# Altium footprint library DrPCB.PcbLib: 910 footprints (part 40 of 57)
Each footprint in its own frame and in the unit in brackets; x right, y up, seen from the top. Pads: shape width x height; smd on the part's side, far side on the other; paste and mask are expansions set on the pad; w line width, h text height; cw(c..) or ccw(c..) is an arc to the next point about the centre after c.
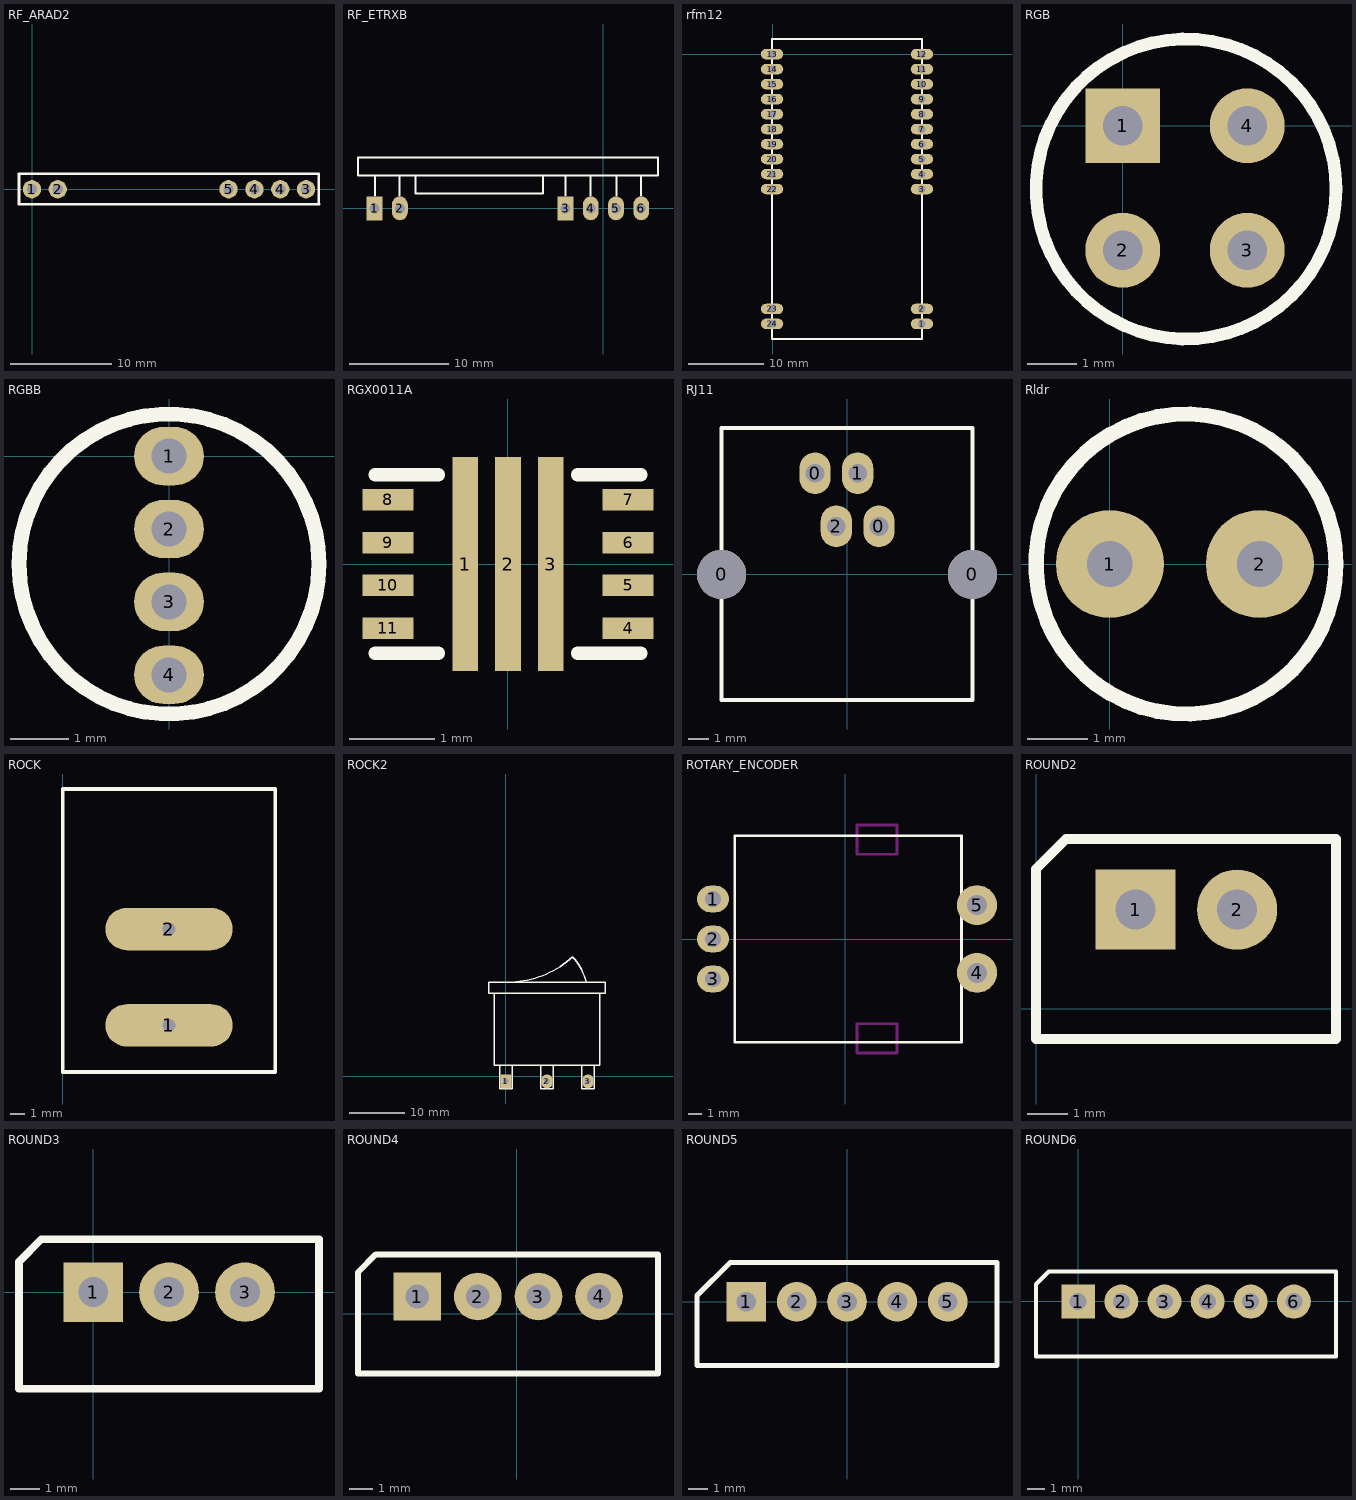
[diagram p39: the footprints below, top view; thin cyan lines are the x and y axes]

## RF_ARAD2 [mm]
pads (6):
  round 1.8 hole 1: 1(-0.013,0) 2(2.527,0) 3(26.947,0) 4(21.867,0) 4(24.407,0) 5(19.327,0)
Top Overlay:
  lines w0.254: -1.283,-1.486 28.219,-1.486 ; -1.283,-1.485 -1.283,1.537 28.194,1.537 28.194,-1.473

## RF_ETRXB [mm] "Module RF, Receiver, ET-RXB-12, ET-RXB-22"
pads (6):
  rect 1.6x2.4 hole 1: 1(-23.03,0) 3(-3.81,0)
  oval 1.6x2.4 hole 1: 2(-20.49,0) 4(-1.27,0) 5(1.27,0) 6(3.81,0)
Top Overlay:
  lines w0.2: -23,1.3 -23,3.3 ; -20.5,1.3 -20.5,3.3 ; -18.9,3.3 -18.9,1.5 -6.1,1.5 -6.1,3.3 ; -3.8,1.3 -3.8,3.3 ; -1.3,1.3 -1.3,3.3 ; 1.3,1.3 1.3,3.3 ; 3.8,1.3 3.8,3.3 ; -24.7,3.3 5.5,3.3 5.5,5.1 -24.7,5.1 -24.7,3.3
3D body "RF_ETRXB.step": height 8.5, standoff -6.05, extent -24.6,-2.05 5.4,6.4

## rfm12 [mm]
pads (24):
  oval 3x1.4 hole 1: 1(19.889,-35.997) 2(19.889,-33.997) 3(19.889,-17.997) 4(19.889,-15.997) 5(19.889,-13.997) 6(19.889,-11.997) 7(19.889,-9.997) 8(19.889,-7.997) 9(19.889,-5.997) 10(19.889,-3.997) 11(19.889,-1.997) 12(19.889,0.003) 13(-0.111,0.003) 14(-0.111,-1.997) 15(-0.111,-3.997) 16(-0.111,-5.997) 17(-0.111,-7.997) 18(-0.111,-9.997) 19(-0.111,-11.997) 20(-0.111,-13.997) 21(-0.111,-15.997) 22(-0.111,-17.997) 23(-0.111,-33.997) 24(-0.111,-35.997)
Top Overlay:
  lines w0.254: -0.131,2.012 19.877,2.012 ; -0.129,2.014 -0.129,-38.004 19.867,-38.004 19.878,-37.993 19.878,2.012

## RGB [mm]
pads (4):
  rect 1.5x1.5 hole 0.8: 1(0,0)
  round 1.5 hole 0.8: 2(0,-2.5) 3(2.5,-2.5) 4(2.5,0)
Top Overlay:
  circle w0.254: c1.27,-1.27 r3.011

## RGBB [mm]
pads (4):
  oval 1.2x1 hole 0.6: 1(0,0) 2(0,-1.25) 3(0,-2.5) 4(0,-3.75)
Top Overlay:
  circle w0.254: c0,-1.85 r2.572

## RGX0011A [mm]
pads (11):
  rect 0.3x2.5 smd paste-2: 1(-0.5,0) 2(0,0) 3(0.5,0)
  rect 0.6x0.25 smd: 4(1.4,-0.75) 5(1.4,-0.25) 6(1.4,0.25) 7(1.4,0.75) 8(-1.4,0.75) 9(-1.4,0.25) 10(-1.4,-0.25) 11(-1.4,-0.75)
Top Overlay:
  lines w0.152: -1.549,-1.041 -0.813,-1.041 ; -1.549,1.041 -0.813,1.041 ; 0.813,-1.041 1.549,-1.041 ; 0.813,1.041 1.549,1.041
Top Paste:
  drawing of 9 lines, arcs and shapes, not listed
3D body "User Library-Tps 62135.SLDPRT": height 1.05, standoff 0, extent -1.55,-1.05 1.55,1.05

## RJ11 [mm]
pads (6):
  round 2.35 hole 2.35: 0(-6,0) 0(6,0)
  oval 1.5x2 hole 0.9: 0(-1.53,4.84) 0(1.53,2.3) 1(0.51,4.84) 2(-0.51,2.3)
Top Overlay:
  lines w0.2: -6,-6 -6,7 6,7 6,-6 -6,-6

## Rldr [mm]
pads (2):
  round 1.8 hole 0.762: 1(0,0) 2(2.5,0)
Top Overlay:
  circle w0.254: c1.27,0 r2.5

## ROCK [mm]
pads (2):
  oval 9x3 hole 0.9: 1(7.499,8.84) 2(7.499,15.64)
Top Overlay:
  lines w0.254: 0,5.54 0,25.54 15,25.54 15,5.54 0,5.54

## ROCK2 [mm]
pads (3):
  rect 2x2.5 hole 1: 1(0,-0.889)
  oval 2x2.5 hole 1: 2(7.4,-0.889) 3(14.8,-0.889)
Top Overlay:
  lines w0.254: -3.1,17 -3.1,15 17.9,15 17.9,17 17.894,17.005 -3.099,17.005 ; -2.1,15 -2.1,2 16.9,2 16.9,15 ; -1.13,1.994 -1.13,-2.261 1.105,-2.261 1.13,-2.235 1.13,1.981 ; -0.399,17.019 ccw(c0.273,34.43) 12.052,21.59 ; 6.274,1.981 6.274,-2.248 6.286,-2.261 8.522,-2.261 ; 8.522,-2.248 8.522,1.994 ; 12.089,21.544 cw(c3.344,13.975) 14.473,17.125 ; 13.678,2.007 13.678,-2.261 15.938,-2.261 15.938,1.994

## ROTARY_ENCODER [mm]
pads (5):
  oval 2.4x2 hole 1.2: 1(-9.9,3) 2(-9.9,0) 3(-9.9,-3)
  round 3 hole 1.5: 4(9.9,-2.54) 5(9.9,2.54)
Top Overlay:
  lines w0.2: -8.262,-7.75 8.738,-7.75 8.738,7.75 -8.262,7.75 -8.262,-7.75
Keep-Out Layer:
  lines w0.2: 0.9,-8.55 3.9,-8.55 3.9,-6.35 0.9,-6.35 0.9,-8.55 ; 0.9,6.35 3.9,6.35 3.9,8.55 0.9,8.55 0.9,6.35
3D body: height 37, standoff 0, extent -0.93,-3 5.07,3
3D body: height 26.64, standoff 0, extent 23.266,-2.019 23.266,-2.019
3D body: height 26.64, standoff 0, extent -2.53,-4.597 6.67,4.597
3D body: height 15, standoff 0, extent -8.255,-7.741 8.725,7.741

## ROUND2 [mm]
pads (2):
  rect 2x2 hole 1: 1(2.488,2.47)
  round 2 hole 1: 2(5.028,2.47)
Top Overlay:
  lines w0.254: 0,-0.762 7.5,-0.762 7.5,4.238 0.751,4.238 0,3.487 0,-0.762

## ROUND3 [mm]
pads (3):
  rect 2x2 hole 1: 1(0.003,0.01)
  round 2 hole 1: 2(2.543,0.01) 3(5.088,0.01)
Top Overlay:
  lines w0.254: -2.484,-3.222 -2.484,1.028 -1.734,1.778 7.566,1.778 7.566,-3.222 -2.484,-3.222

## ROUND4 [mm]
pads (4):
  rect 2x2 hole 1: 1(-4.182,0.715)
  round 2 hole 1: 2(-1.642,0.715) 3(0.903,0.715) 4(3.447,0.719)
Top Overlay:
  lines w0.254: -6.67,-2.517 5.921,-2.517 5.921,2.483 -5.919,2.483 -6.67,1.732 -6.67,-2.517

## ROUND5 [mm]
pads (5):
  rect 2x2 hole 1: 1(-5.08,0)
  round 2 hole 1: 2(-2.54,0) 3(0,0) 4(2.54,0) 5(5.08,0)
Top Overlay:
  lines w0.254: -7.568,-3.213 7.567,-3.213 7.567,1.968 -5.905,1.968 -7.568,0.306 -7.568,-3.213
3D body "99-99-0989.stp": height 5.91, standoff -3.49, extent -7.45,-3.079 7.45,1.821

## ROUND6 [mm]
pads (6):
  rect 2x2 hole 1: 1(-0.004,-0.009)
  round 2 hole 1: 2(2.536,-0.009) 3(5.076,-0.009) 4(7.616,-0.009) 5(10.156,-0.009) 6(12.696,-0.009)
Top Overlay:
  lines w0.254: 15.164,-3.241 -2.492,-3.241 -2.492,1.008 -1.741,1.759 15.176,1.759 ; 15.179,-3.223 15.179,1.759